# Altium integrated library TE PCB Connectors.IntLib: 30 symbols (continued)
## 171825-3
designator P?
Male Header, Pitch 2.5 mm, 1 x 3 Position, Height 10.4 mm, Tail Length 3.6 mm, -20 to 95 degC, RoHS, Bulk; 3D Model: 171825-3.pdf; Connector Type: Header, Unshrouded; Number of Positions Loaded: All; Dynamic Catalog: EI Series; Pitch: 0.098" (2.50mm); Number of Positions: 3; Other Names: 171825-3-ND / A104958; DatasheetVersion: Rev. Y3; PackageReference: THD; PackageDescription: Male Header, Pitch 2.5 mm, 1 x 3 Position, Height 10.4 mm, Tail Length 3.6 mm; Supplier 1: Digi-Key; Supplier Part Number 1: A104958-ND; Standard Package: 1,000; Termination: Solder; Packaging: Bulk; Color: Natural; Contact Type: Male Pin; Number of Rows: 1; Contact Mating Length: 0.295" (7.49mm); RoHS Information: 171825-3 Statement of Compliance; Family: Rectangular Connectors - Headers, Male Pins; Series: EI; Contact Finish: Tin; Category: Connectors, Interconnects; Mounting Type: Through Hole; ComponentLink1Description: Manufacturer URL; ComponentLink1URL: http://www.te.com; ComponentLink2Description: Datasheet; ComponentLink2URL: http://www.te.com/commerce/DocumentDelivery/DDEController?Action=showdoc&DocId=Customer+Drawing%7F171825%7FY3%7Fpdf%7FEnglish%7FENG_CD_171825_Y3.pdf%7F171825-3
footprint TECO-171825-3_V (Connector, 3-Leads, Body 4.9x7.5mm, Pitch 2.5mm)
pins: 1, 2, 3

## 640456-2
designator P?
Male Header, Pitch 2.54 mm, 1 x 2 Position, Height 10.49 mm, Tail Length 3.556 mm, -55 to 105 degC, RoHS, Bulk; Mounting Hole Size: 0.04 / "; Number of Contacts: 2; Primary Type: Interconnect System; Temperature, Operating: -55 to +105 / °C; Pin Spacing: 0.1 / "; Color, Housing: White; Connector Type: MTA-100; Mount Angle: Vertical; Voltage, Rating: 250 / V; Material, Housing: Polyester; Material, Contact: Copper Alloy; Special Features: Pinstrip; Brand/Series: MTA-100 Series; Contact Centerline Spacing: 0.100 / in.; Contact Termination Area Plating: Tin; Agency Approvals: CSA, UL; Angle: Straight; Standards: RoHS Compliant, ELV Compliant, UL 94V-0; Current, Rating: 5 / A; DatasheetVersion: Rev. W; PackageReference: THD; PackageDescription: HDR, 2-Leads, Body 5.715x5.08mm, Pitch 2.54mm; Supplier 1: Digi-Key; Supplier Part Number 1: A1921-ND; Length, Terminal Post: 0.14 / in.; Contact Mating Area Plating: Tin; Color: White; Length, Pin: 0.14 / "; Termination: Solder; Number of Positions: 2; Length, Overall: 0.2 / "; Contact Shape: Square; Contact Plating: Tin; Mounting Type: PC Mount; Type: PCB Plug; Flammability Rating: UL94V-0; Number of Rows: 1; Size, Post: 0.025 / in.; ComponentLink1Description: Manufacturer URL; ComponentLink1URL: http://www.te.com; ComponentLink2Description: Datasheet; ComponentLink2URL: https://datasheet.ciiva.com/11746/0900766b80eb7fdd-11746365.pdf
footprint TECO-640456-2_V (HDR, 2-Leads, Body 5.715x5.08mm, Pitch 2.54mm)
pins: 1, 2

## 640456-3
designator P?
Male Header, Pitch 2.54 mm, 1 x 3 Position, Height 10.03 mm, Tail Length 3.56 mm, -55 to 105 degC; Mounting Hole Size: 0.04 / "; Number of Contacts: 3; Primary Type: Interconnect System; Temperature, Operating: -55 to +105 / °C; Pin Spacing: 0.1 / "; Color, Housing: White; Connector Type: MTA-100; Mount Angle: Vertical; Voltage, Rating: 250 / V; Material, Housing: Polyester; Material, Contact: Copper Alloy; Special Features: Pinstrip; Brand/Series: MTA-100 Series; Contact Centerline Spacing: 0.100 / in.; Contact Termination Area Plating: Tin; Agency Approvals: CSA, UL; Angle: Straight; Standards: RoHS Compliant, ELV Compliant, UL 94V-0; Current, Rating: 5 / A; PackageReference: THD; PackageDescription: Through Hole, 3-Leads, Body 7.62x5.72mm, Pitch 2.54mm; Supplier 1: Digi-Key; Supplier Part Number 1: A19470-ND; Length, Terminal Post: 0.14 / in.; Contact Mating Area Plating: Tin; Color: White; Length, Pin: 0.14 / "; Termination: Solder; Number of Positions: 3; Length, Overall: 0.3 / "; Contact Shape: Square; Contact Plating: Tin; Mounting Type: PC Mount; Type: PCB Plug; Flammability Rating: UL94V-0; Number of Rows: 1; Size, Post: 0.025 / in.; ComponentLink1Description: Manufacturer URL; ComponentLink1URL: http://www.te.com; ComponentLink2Description: Datasheet; ComponentLink2URL: https://datasheet.ciiva.com/16456/eng-ds-82056-mta-0608-16456886.pdf
footprint TECO-640456-3 (Through Hole, 3-Leads, Body 7.62x5.72mm, Pitch 2.54mm)
pins: 1, 2, 3

## 640456-4
designator P?
Male Header, Pitch 2.54 mm, 1 x 4 Position, Height 10.03 mm, Tail Length 3.56 mm, RoHS, Bulk; Mounting Hole Size: 0.04 / "; Number of Contacts: 4; Primary Type: Interconnect System; Temperature, Operating: -55 to +105 / °C; Pin Spacing: 0.1 / "; Color, Housing: White; Connector Type: MTA-100; Mount Angle: Vertical; Voltage, Rating: 250 / V; Material, Housing: Polyester; Material, Contact: Copper Alloy; Special Features: Pinstrip; Brand/Series: MTA-100 Series; Contact Centerline Spacing: 0.100 / in.; Contact Termination Area Plating: Tin; Agency Approvals: CSA, UL; Angle: Straight; Standards: RoHS Compliant, ELV Compliant, UL 94V-0; Current, Rating: 5 / A; PackageReference: THD; PackageDescription: Through Hole, 4-Leads, Body 10.16x5.72mm, Pitch 2.54mm; Supplier 1: Digi-Key; Supplier Part Number 1: A1922-ND; Length, Terminal Post: 0.14 / in.; Contact Mating Area Plating: Tin; Color: White; Length, Pin: 0.14 / "; Termination: Solder; Number of Positions: 4; Length, Overall: 0.4 / "; Contact Shape: Square; Contact Plating: Tin; Mounting Type: PC Mount; Type: PCB Plug; Flammability Rating: UL94V-0; Number of Rows: 1; Size, Post: 0.025 / in.; ComponentLink1Description: Manufacturer URL; ComponentLink1URL: http://www.te.com; ComponentLink2Description: Datasheet; ComponentLink2URL: https://datasheet.ciiva.com/16286/eng-ds-82056-mta-0608-16286228.pdf
footprint TECO-640456-4 (Through Hole, 4-Leads, Body 10.16x5.72mm, Pitch 2.54mm)
pins: 1, 2, 3, 4

## 640456-5
designator P?
Male Header, Pitch 2.54 mm, 1 x 5 Position, Height 10.03 mm, Tail Length 3.56 mm, / -55 to 105 degC, RoHS, Bulk; Mounting Hole Size: 0.04 / "; Number of Contacts: 5; Primary Type: Interconnect System; Temperature, Operating: -55 to +105 / °C; Pin Spacing: 0.1 / "; Color, Housing: White; Connector Type: MTA-100; Mount Angle: Vertical; Voltage, Rating: 250 / V; Material, Housing: Polyester; Material, Contact: Copper Alloy; Special Features: Pinstrip; Brand/Series: MTA-100 Series; Contact Centerline Spacing: 0.100 / in.; Contact Termination Area Plating: Tin; Agency Approvals: CSA, UL; Angle: Straight; Standards: RoHS Compliant, ELV Compliant, UL 94V-0; Current, Rating: 5 / A; DatasheetVersion: Rev. W3; PackageReference: THD; PackageDescription: Male Header, Pitch 2.54 mm, 1 x 5 Position, Height 10.03 mm, Tail Length 3.56 mm; Supplier 1: Digi-Key; Supplier Part Number 1: A19471-ND; Length, Terminal Post: 0.14 / in.; Contact Mating Area Plating: Tin; Color: White; Length, Pin: 0.14 / "; Termination: Solder; Number of Positions: 5; Length, Overall: 0.5 / "; Contact Shape: Square; Contact Plating: Tin; Mounting Type: PC Mount; Type: PCB Plug; Flammability Rating: UL94V-0; Number of Rows: 1; Size, Post: 0.025 / in.; ComponentLink1Description: Manufacturer URL; ComponentLink1URL: http://www.te.com; ComponentLink2Description: Datasheet; ComponentLink2URL: http://sigma.octopart.com/77881742/technical_drawing/TE-Connectivity-640456-5.pdf
footprint TECO-640456-5 (Through Hole, 5-Leads, Body 12.7x5.72mm, Pitch 2.54mm)
pins: 1 DTR, 2 RXI, 3 TXO, 4 VCC, 5 CTS

## 640456-6
designator P?
Male Header, Pitch 2.54 mm, 1 x 6 Position, Height 10.03 mm, Tail Length 3.56 mm, -55 to 105 degC, Bulk; Mounting Hole Size: 0.04 / "; Number of Contacts: 6; Primary Type: Interconnect System; Temperature, Operating: -55 to +105 / °C; Pin Spacing: 0.1 / "; Color, Housing: White; Connector Type: MTA-100; Mount Angle: Vertical; Voltage, Rating: 250 / V; Material, Housing: Polyester; Material, Contact: Copper Alloy; Special Features: Pinstrip; Brand/Series: MTA-100 Series; Contact Centerline Spacing: 0.100 / in.; Contact Termination Area Plating: Tin; Agency Approvals: CSA, UL; Angle: Straight; Standards: RoHS Compliant, ELV Compliant, UL 94V-0; Current, Rating: 5 / A; DatasheetVersion: Rev. W; PackageReference: THD; PackageDescription: Male Header, Pitch 2.54 mm, 1 x 6 Position, Height 10.03 mm, Tail Length 3.56 mm; Supplier 1: Digi-Key; Supplier Part Number 1: A1923-ND; Length, Terminal Post: 0.14 / in.; Contact Mating Area Plating: Tin; Color: White; Length, Pin: 0.14 / "; Termination: Solder; Number of Positions: 6; Length, Overall: 0.6 / "; Contact Shape: Square; Contact Plating: Tin; Mounting Type: PC Mount; Type: PCB Plug; Flammability Rating: UL94V-0; Number of Rows: 1; Size, Post: 0.025 / in.; ComponentLink1Description: Manufacturer URL; ComponentLink1URL: http://www.te.com; ComponentLink2Description: Datasheet; ComponentLink2URL: https://datasheet.ciiva.com/25618/0900766b80eb7fdd-25618163.pdf
footprint TE-640456-6_V (THD, 6-Leads, Body 15.24x5.72mm, Pitch 2.54mm)
pins: 1, 2, 3, 4, 5, 6

## 796136-1
designator BT?
Battery Connector, 1 Cell, CR2032, 2-Pin SMD, RoHS, Tape and Reel; Other Names: A99327 / A99327-ND / A99327CT; Battery Type, Function: Coin Cell, Holder; Style: Holder (Open); For Use With: SY189-ND / - BATT LITH COIN 3V 20MM / SY188-ND / - BATT LITH COIN 3V 20MM / SY138-ND / - BATT LITH COIN 3V 20MM / N189-ND / - BATTERY LITHIUM COIN 3 VOLT 20MM / N188-ND / - BATTERY LITHIUM COIN 3 VOLT 20MM / N138-ND / - BATTERY LITHIUM COIN 3 VOLT 20MM / N037-ND / - BATTERY LITHIUM COIN 3 VOLT 20MM / P037-ND / - BATTERY LITHIUM COIN 3V 20MM / P189-ND / - BATTERY LITHIUM COIN 3V 20MM / P188-ND / - BATTERY LITHIUM COIN 3V 20MM / More...; 3D Model: 796136-1.pdf; Dynamic Catalog: A9932 Series; Battery Series: 2032; Number of Cells: 1; Battery Cell Size: Coin, 20.0mm; PackageReference: SMD; PackageDescription: 2-Pin Surface Mount Device, Body 32.31 x 19.05 mm; Supplier 1: Farnell; Supplier Part Number 1: 2775806; Supplier 2: Digi-Key; Supplier Part Number 2: A99327TR-ND; Supplier 3: Digi-Key; Supplier Part Number 3: A99327CT-ND; Supplier 4: Digi-Key; Supplier Part Number 4: A99327DKR-ND; Standard Package: 1; Height Above Board: 0.26" (6.6mm); RoHS Information: 796136-1 Statement of Compliance; Family: Battery Holders, Clips, Contacts; Termination Style: SMD (SMT) Tab; Category: Battery Products; Mounting Type: PCB, Surface Mount; Mounting Technology: Surface Mount; ComponentLink1Description: Manufacturer URL; ComponentLink1URL: http://www.te.com; ComponentLink2Description: Datasheet; ComponentLink2URL: http://www.te.com/commerce/DocumentDelivery/DDEController?Action=srchrtrv&DocNm=796136&DocType=Customer+Drawing&DocLang=English&DocFormat=pdf&PartCntxt=796136-1
footprint TECO-796136-1_V (SMD, 2-Leads, Body 32.31x19.05mm)
pins: 1 +, 2 -

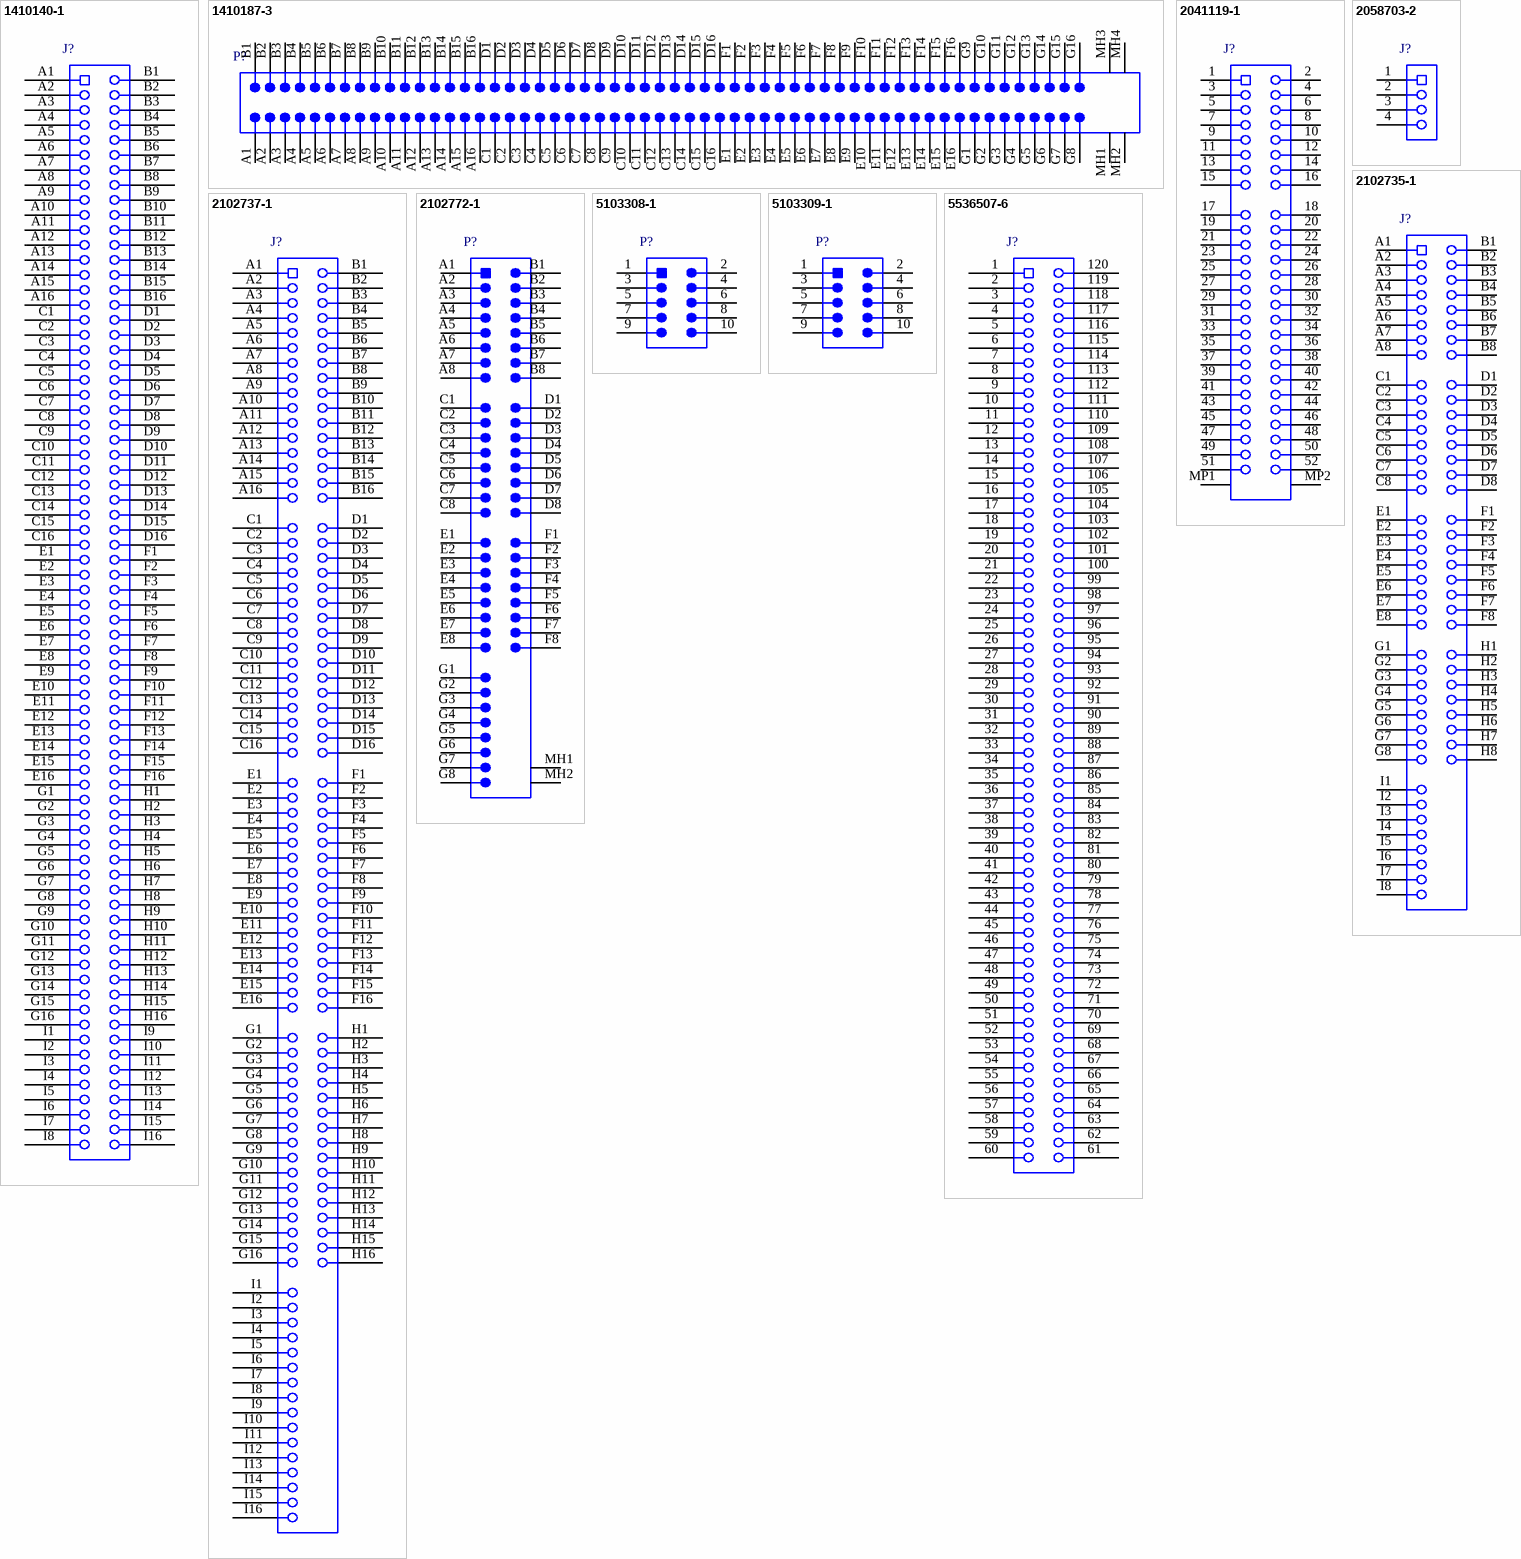
[diagram p2: symbols 1410140-1 to 5536507-6]

## 1410140-1
designator J?
Female Receptacle, Pitch 1.8 mm, 9 x 16 Position, Height 10.5 mm, Tail Length 1.62 mm, -55 to 105 degC, Tube; Catalog Drawings: Vita 41 Series Switchboard; Connector Style: VITA 46, Center; Dynamic Catalog: MultiGig RT Series; Other Names: A99137; Mating Products: A99171-ND / - CONN R/A PLUG DC VITA41; Connector Type: Receptacle, Female Blade Sockets; Connector Usage: Backplane; Number of Positions: 144; 3D Model: 1410140-1.pdf; Pitch: 0.071" (1.80mm); Number of Positions Loaded: All; Number of Columns: 16; Material Flammability Rating: UL94 V-0; PackageReference: THD; PackageDescription: Female Receptacle, Pitch 1.8 mm, 9 x 16 Position, Height 10.5 mm, Tail Length 1.62 mm; Supplier 1: Newark; Supplier Part Number 1: 32M6802; Supplier 2: Newark; Supplier Part Number 2: 35M0225; Supplier 3: Farnell; Supplier Part Number 3: 1329926; Supplier 4: Digi-Key; Supplier Part Number 4: A99137-ND; Operating Temperature: -55°C ~ 105°C; Color: Black; Contact Finish Thickness: 50µin (1.27µm); Packaging: Tube; Termination: Solder; Family: Backplane Connectors - Specialized; Contact Finish: Gold; RoHS Information: 1410140-1 Statement of Compliance; Mounting Type: Through Hole; Series: MultiGig RT2; Standard Package: 17; Number of Rows: 9; Category: Connectors, Interconnects; ComponentLink1Description: Manufacturer URL; ComponentLink1URL: http://www.te.com; ComponentLink2Description: Datasheet; ComponentLink2URL: http://www.te.com/commerce/DocumentDelivery/DDEController?Action=showdoc&DocId=Catalog+Section%7F1773095_Backplane_Connector_MULTIGIG_RT%7F0512%7Fpdf%7FEnglish%7FENG_CS_1773095_Backplane_Connector_MULTIGIG_RT_0512.pdf%7F1410140-1
footprint BTB1-8-V144F (Receptacle, 144-Leads, Body 29.41x18.6mm, Pitch 1.8mm)
footprint TECO-1410140-1_RTM (Receptacle, 144-Leads, Body 29.41x18.6mm, Pitch 1.8mm)
pins: A1, A2, A3, A4, A5, A6, A7, A8, A9, A10, A11, A12, A13, A14, A15, A16, B1, B2, B3, B4, B5, B6, B7, B8, B9, B10, B11, B12, B13, B14, B15, B16, C1, C2, C3, C4, C5, C6, C7, C8, C9, C10, C11, C12, C13, C14, C15, C16, D1, D2, D3, D4, D5, D6, D7, D8, D9, D10, D11, D12, D13, D14, D15, D16, E1, E2, E3, E4, E5, E6, E7, E8, E9, E10, E11, E12, E13, E14, E15, E16, F1, F2, F3, F4, F5, F6, F7, F8, F9, F10, F11, F12, F13, F14, F15, F16, G1, G2, G3, G4, G5, G6, G7, G8, G9, G10, G11, G12, G13, G14, G15, G16, H1, H2, H3, H4, H5, H6, H7, H8, H9, H10, H11, H12, H13, H14, H15, H16, I1, I2, I3, I4, I5, I6, I7, I8, I9, I10, I11, I12, I13, I14, I15, I16

## 1410187-3
designator P?
CONN R/A PLUG DC VITA46; Catalog Drawings: Vita 46 Series; Connector Style: VITA 46, Center; Dynamic Catalog: MultiGig RT Series; Other Names: A99143; Connector Type: Plug, Male Blades; Contact Layout, Typical: 32 Signal Pairs, 8 Single Signal, 40 Ground; Connector Usage: Daughtercard; Number of Positions: 112; 3D Model: 1410187-3.pdf; Pitch: 0.071" (1.80mm); Number of Positions Loaded: All; Number of Columns: 16; Material Flammability Rating: UL94 V-0; DatasheetVersion: Rev. A3; PackageReference: THD; PackageDescription: TH, 112-Leads, Body 28.68x22.5mm, Pitch 1.8mm; Supplier 1: Newark; Supplier Part Number 1: 35M0230; Supplier 2: Newark; Supplier Part Number 2: 78X5980; Supplier 3: Farnell; Supplier Part Number 3: 1329934; Supplier 4: Digi-Key; Supplier Part Number 4: A99143-ND; Features: Board Guide; Operating Temperature: -55°C ~ 105°C; Color: Black; Contact Finish Thickness: 50µin (1.27µm); Packaging: Tube; Termination: Solder; Family: Backplane Connectors - Specialized; Contact Finish: Gold; RoHS Information: 1410187-3 Statement of Compliance; Mounting Type: Board Edge; Through Hole, Right Angle; Series: MultiGig RT2; Standard Package: 17; Number of Rows: 7; Category: Connectors, Interconnects; ComponentLink1Description: Manufacturer URL; ComponentLink1URL: http://www.te.com; ComponentLink2Description: Datasheet; ComponentLink2URL: http://datasheet.octopart.com/1410187-3-Tyco-Electronics-datasheet-13549024.pdf
footprint BTB1-8-4H112M (TH, 112-Leads, Body 28.68x22.5mm, Pitch 1.8mm)
pins: A1, A2, A3, A4, A5, A6, A7, A8, A9, A10, A11, A12, A13, A14, A15, A16, B1, B2, B3, B4, B5, B6, B7, B8, B9, B10, B11, B12, B13, B14, B15, B16, C1, C2, C3, C4, C5, C6, C7, C8, C9, C10, C11, C12, C13, C14, C15, C16, D1, D2, D3, D4, D5, D6, D7, D8, D9, D10, D11, D12, D13, D14, D15, D16, E1, E2, E3, E4, E5, E6, E7, E8, E9, E10, E11, E12, E13, E14, E15, E16, F1, F2, F3, F4, F5, F6, F7, F8, F9, F10, F11, F12, F13, F14, F15, F16, G1, G2, G3, G4, G5, G6, G7, G8, G9, G10, G11, G12, G13, G14, G15, G16, MH1, MH2, MH3, MH4

## 2041119-1
designator J?
mSATA & PCI Express Mini Card Connector, Pitch 0.4 mm, 52 Position, Height 4 mm, RoHS, Tape and Reel; Body Orientation: Right Angle; Number of Contacts: 52; PackageReference: SMD; PackageDescription: mSATA & PCI Express Mini Card Connector, Pitch 0.4 mm, 52 Position, Height 4 mm; Supplier 1: Newark; Supplier Part Number 1: 98X5859; Supplier 2: Digi-Key; Supplier Part Number 2: A108265TR-ND; Supplier 3: Digi-Key; Supplier Part Number 3: A108265CT-ND; Supplier 4: Digi-Key; Supplier Part Number 4: A108265DKR-ND; Termination Method: Solder; Mounting: Surface Mount; Operating Temperature: N/A; Maximum Voltage Rating: N/A; Dimension: 29.9 x 9.02 x 4 mm; Maximum Current Rating: N/A; Maximum Contact Resistance: N/A; Family: 2041119; RoHS: Yes; Type: Mini PCI Express Card; Pitch: N/A; Card Thickness: N/A; Mounting Technology: Surface Mount; ComponentLink1Description: Manufacturer URL; ComponentLink1URL: http://www.te.com; ComponentLink2Description: Datasheet; ComponentLink2URL: http://www.te.com/commerce/DocumentDelivery/DDEController?Action=showdoc&DocId=Customer+Drawing%7F2041119%7FD%7Fpdf%7FEnglish%7FENG_CD_2041119_D.pdf%7F2041119-1
footprint TECO-2041119-1_3_V (Connector, 52-Leads, Body 29.9x8.2mm, Pitch 0.4mm)
pins: 1, 2, 3, 4, 5, 6, 7, 8, 9, 10, 11, 12, 13, 14, 15, 16, 17, 18, 19, 20, 21, 22, 23, 24, 25, 26, 27, 28, 29, 30, 31, 32, 33, 34, 35, 36, 37, 38, 39, 40, 41, 42, 43, 44, 45, 46, 47, 48, 49, 50, 51, 52, MP1, MP2

## 2058703-2
designator J?
Solid State Lighting Connector, Pitch 4 mm, 1 x 4 Position, Height 4.13 mm, -40 to 105 degC, RoHS, Tape and Reel; Style: Board to Board or Cable; 3D Model: 2058703-2.pdf; Mating Products: A99894-ND / - CONN HSNG RCPT&BLADE 4POS BLACK / A99891-ND / - CONN HSNG RCPT&BLADE 4POS NATRL; Pitch: 0.157" (4.00mm); Number of Positions: 4; Other Names: A99882DKR; DatasheetVersion: Rev. B3; PackageReference: SMD; PackageDescription: Solid State Lighting Connector, Pitch 4 mm, 1 x 4 Position, Height 4.13 mm; Supplier 1: Newark; Supplier Part Number 1: 34R9731; Supplier 2: Farnell; Supplier Part Number 2: 1761491; Supplier 3: Digi-Key; Supplier Part Number 3: A99882TR-ND; Supplier 4: Digi-Key; Supplier Part Number 4: A99882CT-ND; Supplier 5: Digi-Key; Supplier Part Number 5: A99882DKR-ND; Standard Package: 1; Termination: Solder; Housing Color: Natural; Packaging: Digi-Reel®; Housing Material: Liquid Crystal Polymer (LCP); RoHS Information: 2058703-2 Statement of Compliance; Family: Solid State Lighting Connectors; Features: Latch Lock; Type: Blade and Receptacle; Contact Material: Copper Alloy; Contact Finish: Tin; Category: Connectors, Interconnects; Mounting Type: Surface Mount, Right Angle; ComponentLink1Description: Manufacturer URL; ComponentLink1URL: http://www.te.com; ComponentLink2Description: Datasheet; ComponentLink2URL: http://www.te.com/commerce/DocumentDelivery/DDEController?Action=showdoc&DocId=Customer+Drawing%7F2058703%7FB3%7Fpdf%7FEnglish%7FENG_CD_2058703_B3.pdf%7F2058703-2
footprint TECO-2058703-2_V (SMD, 4-Leads, Body 12.25x16.7mm, Pitch 4mm)
pins: 1, 2, 3, 4

## 2102735-1
designator J?
Female, Pitch 1.8 mm, 9 x 8 Position, Height 10.5 mm, Tail Length 1.62 mm; Mounting Angle: Vertical; Brand: TE Connectivity / AMP; Number of Positions: 72 Position; DatasheetVersion: Rev. C; PackageReference: THD; PackageDescription: Female, Pitch 1.8 mm, 9 x 8 Position, Height 10.5 mm, Tail Length 1.62 mm; Supplier 1: Newark; Supplier Part Number 1: 72Y1256; Supplier 2: Farnell; Supplier Part Number 2: 2535707; Supplier 3: Digi-Key; Supplier Part Number 3: 2102735-1-ND; Product Category: High Speed / Modular Connectors; Product: Receptacle Housings; Number of Rows: 8 Row; Housing Material: Liquid Crystal Polymer (LCP); RoHS: True; Tradename: VITA; Series: MULTI-GIG RT2; Contact Plating: Gold; Contact Material: Phosphor Bronze; Termination Style: Through Hole; Mounting Technology: Through Hole; ComponentLink1Description: Manufacturer URL; ComponentLink1URL: http://www.te.com; ComponentLink2Description: Datasheet; ComponentLink2URL: http://www.te.com/commerce/DocumentDelivery/DDEController?Action=showdoc&DocId=Customer+Drawing%7F2102735%7FC%7Fpdf%7FEnglish%7FENG_CD_2102735_C_2102735-c_drw.pdf%7F2102735-1
footprint TECO-2102735-1_V (Female, Pitch 1.8mm, 9x8 Position, Height 10.5mm, Tail Length 1.62mm)
pins: A1, A2, A3, A4, A5, A6, A7, A8, B1, B2, B3, B4, B5, B6, B7, B8, C1, C2, C3, C4, C5, C6, C7, C8, D1, D2, D3, D4, D5, D6, D7, D8, E1, E2, E3, E4, E5, E6, E7, E8, F1, F2, F3, F4, F5, F6, F7, F8, G1, G2, G3, G4, G5, G6, G7, G8, H1, H2, H3, H4, H5, H6, H7, H8, I1, I2, I3, I4, I5, I6, I7, I8

## 2102737-1
designator J?
MultiGig RT, Pitch 1.8 mm, 9 x 16 Position, Height 10.3 mm, RoHS; Body Orientation: Straight; Product Length (mm): 31.22mm; Product Depth (mm): 18.6mm; Gender: RCP; Number of Contact Rows: 9; Product Height (mm): 10.5mm; Pitch (mm): 1.8mm; Number of Contacts: 144POS; DatasheetVersion: Rev. C; PackageReference: THD; PackageDescription: MultiGig RT, Pitch 1.8 mm, 9 x 16 Position, Height 10.3 mm; Supplier 1: Newark; Supplier Part Number 1: 85W3315; Supplier 2: Farnell; Supplier Part Number 2: 2778179; Supplier 3: Digi-Key; Supplier Part Number 3: 2102737-1-ND; Termination Method: Press Fit; Housing Color: Black; Housing Material: Liquid Crystal Polymer; Type: Backplane; Contact Plating: Gold Over Nickel; Contact Material: Phosphor Bronze; Mounting Style: Through Hole; Mounting Technology: Through Hole; ComponentLink1Description: Manufacturer URL; ComponentLink1URL: http://www.te.com; ComponentLink2Description: Datasheet; ComponentLink2URL: http://www.te.com/commerce/DocumentDelivery/DDEController?Action=showdoc&DocId=Customer+Drawing%7F2102737%7FC%7Fpdf%7FEnglish%7FENG_CD_2102737_C_2102737-c_drw.pdf%7F2102737-1
footprint TECO-2102737-1_V (Connector, 144-Leads, Body 31.22x18.6mm, Pitch 1.8mm)
pins: A1, A2, A3, A4, A5, A6, A7, A8, A9, A10, A11, A12, A13, A14, A15, A16, B1, B2, B3, B4, B5, B6, B7, B8, B9, B10, B11, B12, B13, B14, B15, B16, C1, C2, C3, C4, C5, C6, C7, C8, C9, C10, C11, C12, C13, C14, C15, C16, D1, D2, D3, D4, D5, D6, D7, D8, D9, D10, D11, D12, D13, D14, D15, D16, E1, E2, E3, E4, E5, E6, E7, E8, E9, E10, E11, E12, E13, E14, E15, E16, F1, F2, F3, F4, F5, F6, F7, F8, F9, F10, F11, F12, F13, F14, F15, F16, G1, G2, G3, G4, G5, G6, G7, G8, G9, G10, G11, G12, G13, G14, G15, G16, H1, H2, H3, H4, H5, H6, H7, H8, H9, H10, H11, H12, H13, H14, H15, H16, I1, I2, I3, I4, I5, I6, I7, I8, I9, I10, I11, I12, I13, I14, I15, I16

## 2102772-1
designator P?
Right Angle Plug Connector, 7 x 8 Position, Height 14.7 mm, RoHS; Brand: TE Connectivity / AMP; Pitch: 20.3 mm; Number of Positions: 56 Position; DatasheetVersion: Rev. D; PackageReference: THD; PackageDescription: Right Angle Plug Connector, 7 x 8 Position, Height 14.7 mm; Supplier 1: Newark; Supplier Part Number 1: 53W3311; Supplier 2: Newark; Supplier Part Number 2: 82Y6001; Supplier 3: Farnell; Supplier Part Number 3: 2778181; Supplier 4: Digi-Key; Supplier Part Number 4: 2102772-1-ND; Mounting Angle: Right; Product Category: High Speed / Modular Connectors; Packaging: Tube; Factory Pack Quantity: 30; Housing Material: Liquid Crystal Polymer (LCP); RoHS: Details; Tradename: VITA; Series: MULTI-GIG RT2; Termination Style: Through Hole; Mounting Technology: Through Hole; ComponentLink1Description: Manufacturer URL; ComponentLink1URL: http://www.te.com; ComponentLink2Description: Datasheet; ComponentLink2URL: http://www.te.com/commerce/DocumentDelivery/DDEController?Action=showdoc&DocId=Customer+Drawing%7F2102772%7FD%7Fpdf%7FEnglish%7FENG_CD_2102772_D.pdf%7F2102772-1
footprint TECO-2102772-1_V (THD, 56-Leads, Body 16.08x22.31mm, Height 14.7mm)
pins: A1, A2, A3, A4, A5, A6, A7, A8, B1, B2, B3, B4, B5, B6, B7, B8, C1, C2, C3, C4, C5, C6, C7, C8, D1, D2, D3, D4, D5, D6, D7, D8, E1, E2, E3, E4, E5, E6, E7, E8, F1, F2, F3, F4, F5, F6, F7, F8, G1, G2, G3, G4, G5, G6, G7, G8, MH1, MH2

## 5103308-1
designator P?
Male Header, Pitch 2.54 mm, 2 x 5 Position, Height 9.85 mm, Tail Length 3.05 mm, RoHS, Tube; Catalog Drawings: Low Profile Shrouded Straight; Dynamic Catalog: AMP-Latch Series; Other Names: A33159; Mating Products: 1658624-1-ND / - CONN RCPT 10POS POLAR GOLD / 1658527-4-ND / - CONN RCPT 10POS .100 W/STR RELF / 1658527-3-ND / - CONN RCPT 10POS .100 622 SERIES / 1658526-3-ND / - CONN RCPT 10POS VERT GOLD / 1658526-5-ND / - 609-1041LF FEM SOCKT,LEAD FREE / 1658526-4-ND / - 609-1030LF FEM SOCKT,LEAD FREE / ASC10B-ND / - CONN IDC SOCKET 10POS GOLD / ASC10H-ND / - CONN IDC SOCKET 10POS 15 GOLD / AKC10B-ND / - CONN IDC SKT 10POS W/POL GOLD / AKC10H-ND / - CONN IDC SKT 10POS W/POL 15 GOLD / More...; Connector Type: Header, Shrouded; Number of Positions: 10; Row Spacing: 0.100" (2.54mm); 3D Model: 5103308-1.pdf; Featured Product: AMP-LATCH Ribbon Cable Connectors; Number of Positions Loaded: All; PackageReference: THD; PackageDescription: Connector, 10-Leads, Body 20.32x9.14mm, Pitch 2.54mm; Supplier 1: Digi-Key; Supplier Part Number 1: A33159-ND; Color: Black; Contact Finish Thickness: 15µin (0.38µm); Packaging: Tube; Termination: Solder; Family: Rectangular Connectors - Headers, Male Pins; Contact Finish: Gold or Gold-Palladium; Contact Type: Male Pin; Contact Mating Length: 0.240" (6.10mm); Pitch: 0.100" (2.54mm); RoHS Information: 5103308-1 Statement of Compliance; Mounting Type: Through Hole; Series: AMP-Latch; Standard Package: 125; Number of Rows: 2; Category: Connectors, Interconnects; ComponentLink1Description: Manufacturer URL; ComponentLink1URL: http://www.te.com; ComponentLink2Description: Datasheet; ComponentLink2URL: http://www.onlinecomponents.com/productFiles/mf-AMP/eng_cat_889409_0699_96_.pdf
footprint TECO-5103308-1_V (Connector, 10-Leads, Body 20.32x9.14mm, Pitch 2.54mm)
pins: 1, 2, 3, 4, 5, 6, 7, 8, 9, 10

## 5103309-1
designator P?
Male Header, Pitch 2.54 mm, 2 x 5 Position, Height 9.855 mm, Tail Length 3.048 mm, -65 to 105 degC, RoHS, Tube; Catalog Drawings: Low Profile Shrouded Straight; Dynamic Catalog: AMP-Latch Series; Other Names: A33160; Mating Products: 1658624-1-ND / - CONN RCPT 10POS POLAR GOLD / 1658527-4-ND / - CONN RCPT 10POS .100 W/STR RELF / 1658527-3-ND / - CONN RCPT 10POS .100 622 SERIES / 1658526-3-ND / - CONN RCPT 10POS VERT GOLD / 1658526-5-ND / - 609-1041LF FEM SOCKT,LEAD FREE / 1658526-4-ND / - 609-1030LF FEM SOCKT,LEAD FREE / ASC10B-ND / - CONN IDC SOCKET 10POS GOLD / ASC10H-ND / - CONN IDC SOCKET 10POS 15 GOLD / AKC10B-ND / - CONN IDC SKT 10POS W/POL GOLD / AKC10H-ND / - CONN IDC SKT 10POS W/POL 15 GOLD / More...; Connector Type: Header, Shrouded; Number of Positions: 10; Row Spacing: 0.100" (2.54mm); 3D Model: 5103309-1.pdf; Featured Product: AMP-LATCH Ribbon Cable Connectors; Number of Positions Loaded: All; DatasheetVersion: Rev. E1; PackageReference: THD; PackageDescription: Male Header, Pitch 2.54 mm, 2 x 5 Position, Height 9.855 mm, Tail Length 3.048 mm; Supplier 1: Digi-Key; Supplier Part Number 1: A33160-ND; Color: Black; Contact Finish Thickness: 30µin (0.76µm); Packaging: Tube; Termination: Solder; Family: Rectangular Connectors - Headers, Male Pins; Contact Finish: Gold or Gold-Palladium; Contact Type: Male Pin; Contact Mating Length: 0.240" (6.10mm); Pitch: 0.100" (2.54mm); RoHS Information: 5103309-1 Statement of Compliance; Mounting Type: Through Hole; Series: AMP-Latch; Standard Package: 125; Number of Rows: 2; Category: Connectors, Interconnects; ComponentLink1Description: Manufacturer URL; ComponentLink1URL: http://www.te.com; ComponentLink2Description: Datasheet; ComponentLink2URL: http://www.te.com/commerce/DocumentDelivery/DDEController?Action=showdoc&DocId=Customer+Drawing%7F5103309%7FE1%7Fpdf%7FEnglish%7FENG_CD_5103309_E1.pdf%7F5103309-1
footprint TECO-5103309-1_V (Male Header, 10-Leads, Body 20.32x9.144mm, Pitch 2.54mm)
pins: 1, 2, 3, 4, 5, 6, 7, 8, 9, 10

## 5536507-6
designator J?
Female Header, Pitch 2 mm, 4 x 30 Position, Height 8.8 mm, Tail Length 2.73 mm, -55 to 125 degC, RoHS, Tube; Catalog Drawings: Z-Pack_2mm FB (Futurebus+); Connector Style: Futurebus; Dynamic Catalog: Z-Pack Series; Other Names: A31566; Mating Products: 5536524-6-ND / - 2MMFB,ASY,120,SIG,HDR,EN,5.75 / 5223513-6-ND / - 2MMFB,IS,ASY,120,SIG,HDR,SL / 536504-6-ND / - 2MM FB,ASY,120,SIG,HDR,EN,6.50 / 5536501-6-ND / - CONN HEADER 120POS 4ROW 2MM GOLD; Connector Type: Receptacle, Female Sockets; Number of Positions: 120; 3D Model: 5536507-6.pdf; Pitch: 0.079" (2.00mm); Number of Positions Loaded: All; Material Flammability Rating: UL94 V-0; Voltage Rating: 30V; DatasheetVersion: Rev. P; PackageReference: THD; PackageDescription: Female Header, Pitch 2 mm, 4 x 30 Position, Height 8.8 mm, Tail Length 2.73 mm; Supplier 1: Digi-Key; Supplier Part Number 1: A31566-ND; Operating Temperature: -55°C ~ 125°C; Features: Board Guide, Spacer; Color: Natural; Packaging: Tube; Termination: Solder; Family: Backplane Connectors - Specialized; Contact Finish: Gold; RoHS Information: 5536507-6 Statement of Compliance; Mounting Type: Board Edge; Through Hole, Right Angle; Series: Z-Pack; Standard Package: 9; Number of Rows: 4; Category: Connectors, Interconnects; ComponentLink1Description: Manufacturer URL; ComponentLink1URL: http://www.te.com; ComponentLink2Description: Datasheet; ComponentLink2URL: http://www.te.com/commerce/DocumentDelivery/DDEController?Action=showdoc&DocId=Customer+Drawing%7F5536507%7FP%7Fpdf%7FEnglish%7FENG_CD_5536507_P.pdf%7F5536507-6
footprint TECO-5536507-6_V (THD, 120-Leads, Body 59.88x20.45mm, Pitch 2mm)
pins: 1, 2, 3, 4, 5, 6, 7, 8, 9, 10, 11, 12, 13, 14, 15, 16, 17, 18, 19, 20, 21, 22, 23, 24, 25, 26, 27, 28, 29, 30, 31, 32, 33, 34, 35, 36, 37, 38, 39, 40, 41, 42, 43, 44, 45, 46, 47, 48, 49, 50, 51, 52, 53, 54, 55, 56, 57, 58, 59, 60, 61, 62, 63, 64, 65, 66, 67, 68, 69, 70, 71, 72, 73, 74, 75, 76, 77, 78, 79, 80, 81, 82, 83, 84, 85, 86, 87, 88, 89, 90, 91, 92, 93, 94, 95, 96, 97, 98, 99, 100, 101, 102, 103, 104, 105, 106, 107, 108, 109, 110, 111, 112, 113, 114, 115, 116, 117, 118, 119, 120